# Altium footprint library 20210518.PcbLib: 414 footprints (part 4 of 26)
Each footprint in its own frame and in the unit in brackets; x right, y up, seen from the top. Pads: shape width x height; smd on the part's side, far side on the other; paste and mask are expansions set on the pad; w line width, h text height; cw(c..) or ccw(c..) is an arc to the next point about the centre after c.
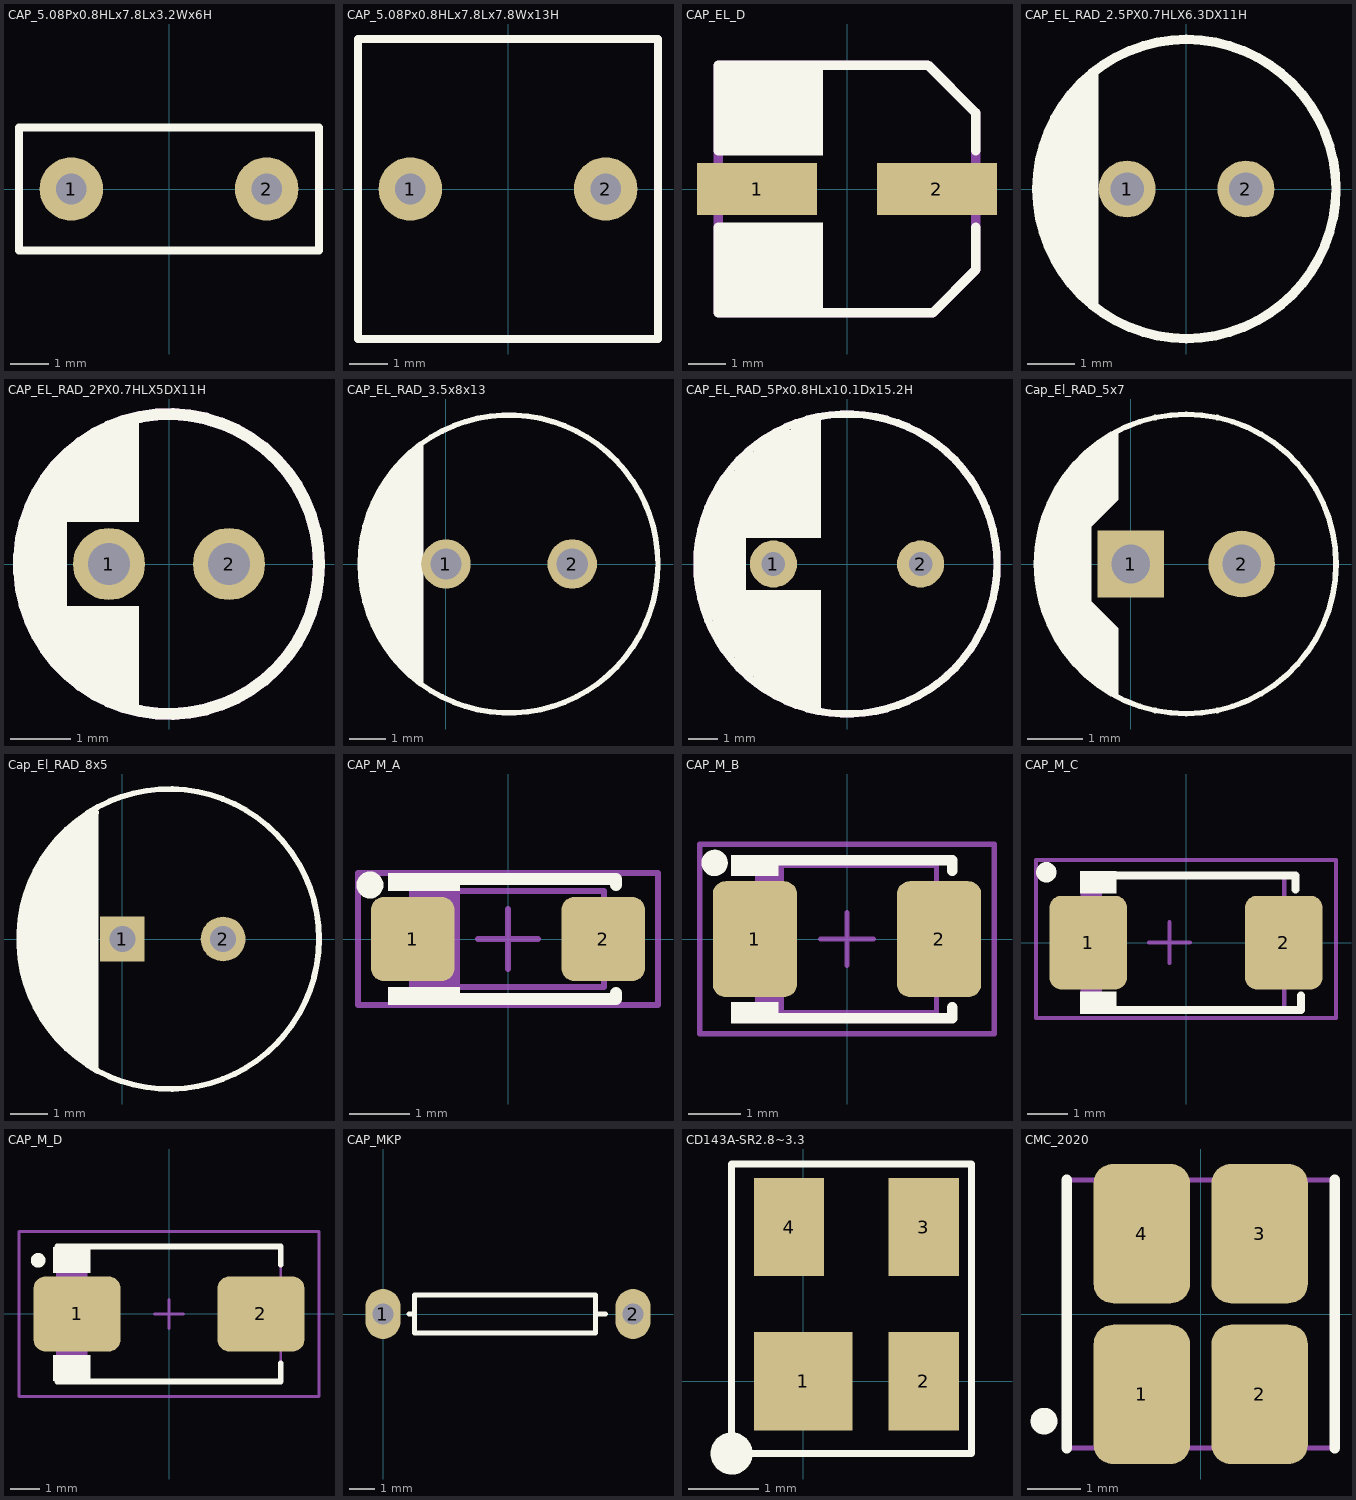
[diagram p3: the footprints below, top view; thin cyan lines are the x and y axes]

## CAP_5.08Px0.8HLx7.8Lx3.2Wx6H [mm] "Capacitor, Ceramic, Thru-Hole, Dipped Radial; Body 7.8 x 3.2 mm (WxT) Pin Spacing 5.08 mm (typ)"
height 6
pads (2):
  round 1.65 hole 0.8: 1(-2.54,0) 2(2.54,0)
Top Overlay:
  lines w0.2: -3.9,-1.6 3.9,-1.6 3.9,1.6 -3.9,1.6 -3.9,-1.6
3D body: height 2, standoff 0, extent -2.667,-0.2 -2.269,0.2
3D body: height 2, standoff 0, extent 2.341,-0.127 2.739,0.272
3D body: height 6, standoff 2, extent -3.937,-1.651 3.937,1.651

## CAP_5.08Px0.8HLx7.8Lx7.8Wx13H [mm] "Capacitor, MKT, Thru-Hole, Dipped Radial; Body 7.8 x 7.8mm (WxT) Pin Spacing 5.08 mm (typ)"
height 13
pads (2):
  round 1.65 hole 0.8: 1(-2.54,0) 2(2.54,0)
Top Overlay:
  lines w0.2: -3.9,-3.9 3.9,-3.9 3.9,3.9 -3.9,3.9 -3.9,-3.9
3D body: height 2, standoff 0, extent -2.667,-0.2 -2.269,0.2
3D body: height 2, standoff 0, extent 2.341,-0.127 2.739,0.272
3D body: height 13, standoff 0, extent -3.937,-3.9 3.937,3.9

## CAP_EL_D [mm] "Electrolitic Capacitor, D size SMD"
height 5.4
pads (2):
  rect 3.2x1.4 smd: 1(-2.4,0) 2(2.4,0)
Top Overlay:
  rectangle: -3.429,0.889 -0.635,3.175
  rectangle: -3.429,-3.175 -0.635,-0.889
  lines w0.254: -3.429,-1.016 -3.429,-3.302 2.286,-3.302 3.429,-2.159 3.429,-1.651 3.429,-1.016 ; -3.429,1.016 -3.429,3.302 2.159,3.302 3.429,2.032 3.429,1.016
Mechanical 13:
  lines w0.254: -3.429,-3.302 -3.429,3.302 2.159,3.302 3.429,2.032 3.429,-2.159 2.286,-3.302 -3.429,-3.302
Mechanical 15:
  lines w0.254: -3.429,-3.302 -3.429,3.302 2.159,3.302 3.429,2.032 3.429,-2.159 2.286,-3.302 -3.429,-3.302
3D body: height 5.41, standoff -0.01, extent -3.4,-3.3 3.6,3.3

## CAP_EL_RAD_2.5PX0.7HLX6.3DX11H [mm] "Capacitor,2.5mm pinspacing, 5mm diamater, 11mm height"
pads (2):
  round 1.2 hole 0.7: 1(-1.25,0) 2(1.25,0)
Top Overlay:
  circle w0.2: c0,0 r3.15
  region: -1.86,2.54 -1.86,-2.5 -1.94,-2.5 -2.4,-2.04 -2.43,-2.04 -2.43,-1.89 -2.89,-1.43 -2.89,-1.02 -3.11,-0.8 -3.11,-0.07 -3.17,-0.01 -3.13,0.03 -3.13,0.81 -2.87,1.07 -2.87,1.53
3D body: height 12.61, standoff -3.96, extent -3.372,-3.394 3.444,3.414

## CAP_EL_RAD_2PX0.7HLX5DX11H [mm] "Capacitor,2mm pinspacing, 5mm diamater, 11mm height"
pads (2):
  round 1.2 hole 0.7: 1(-1,0) 2(1,0)
Top Overlay:
  circle w0.2: c0,0 r2.5
  region: -0.5,0.7 -1.7,0.7 -1.7,-0.7 -0.5,-0.7 -0.5,-2.4 -0.9,-2.4 -1.2,-2.1 -1.4,-2.1 -2.2,-1.3 -2.2,-1 -2.5,-0.7 -2.5,0.5 -2.4,0.6 -2.4,0.9 -2.2,1.1 -2.2,1.3 -1.3,2.2 -1.1,2.2 -0.9,2.4 -0.5,2.4
3D Body:
  circle w0.2: c0,0 r2.5
Mechanical 13:
  circle w0.2: c0,0 r2.5
3D body: height 11, standoff -19, extent -2.5,-2.5 2.5,2.5

## CAP_EL_RAD_3.5x8x13 [mil]
pads (2):
  round 54 hole 34 mask-1000: 1(0,0) 2(137.8,0)
Top Overlay:
  circle w6: c68.9,0 r162.5
  region: -24.79,-130.34 -24.79,130.34 -14.7,137.59 -0.37,144.81 0.84,145.37 1.36,145.62 1.98,146.78 1.98,147.17 1.98,147.57 1.52,148.69 -0.27,149.23 -0.84,148.97 -8.92,145.19 -24.42,135.52 -27.94,132.96 -33.12,129.18 -47.66,116.56 -61.88,100.35 -73.85,82.42 -83.39,63.08 -90.32,42.66 -94.53,21.52 -95.94,0 -94.53,-21.52 -90.32,-42.66 -83.39,-63.08 -73.85,-82.42 -61.88,-100.35 -47.66,-116.56 -31.45,-130.77 -9.46,-144.88 -1.6,-148.61 -1.03,-148.88 0.77,-148.34 1.24,-147.21 1.24,-146.82 1.24,-146.42 0.62,-145.27 0.1,-145.03 -6.62,-141.84 -19.83,-133.9
  lines w3.94: -26.77,-130.55 -26.77,131.36 ; -0.75,-146.82 cw(c68.9,0) 0,147.17
Top Solder:
  region: 0,27.23 -7.05,26.31 -13.62,23.58 -19.26,19.26 -23.58,13.62 -26.31,7.05 -27.23,0 -26.31,-7.05 -23.58,-13.62 -19.26,-19.26 -13.62,-23.58 -7.05,-26.31 0,-27.23 7.05,-26.31 13.62,-23.58 19.26,-19.26 23.58,-13.62 26.31,-7.05 27.23,0 26.31,7.05 23.58,13.62 19.26,19.26 13.62,23.58 7.05,26.31
  region: 137.8,-27.23 144.84,-26.31 151.41,-23.58 157.05,-19.26 161.38,-13.62 164.1,-7.05 165.03,0 164.1,7.05 161.38,13.62 157.05,19.26 151.41,23.58 144.84,26.31 137.8,27.23 130.75,26.31 124.18,23.58 118.54,19.26 114.21,13.62 111.49,7.05 110.56,0 111.49,-7.05 114.21,-13.62 118.54,-19.26 124.18,-23.58 130.75,-26.31
Bottom Solder:
  region: 0,27.23 -7.05,26.31 -13.62,23.58 -19.26,19.26 -23.58,13.62 -26.31,7.05 -27.23,0 -26.31,-7.05 -23.58,-13.62 -19.26,-19.26 -13.62,-23.58 -7.05,-26.31 0,-27.23 7.05,-26.31 13.62,-23.58 19.26,-19.26 23.58,-13.62 26.31,-7.05 27.23,0 26.31,7.05 23.58,13.62 19.26,19.26 13.62,23.58 7.05,26.31
  region: 137.8,-27.23 144.84,-26.31 151.41,-23.58 157.05,-19.26 161.38,-13.62 164.1,-7.05 165.03,0 164.1,7.05 161.38,13.62 157.05,19.26 151.41,23.58 144.84,26.31 137.8,27.23 130.75,26.31 124.18,23.58 118.54,19.26 114.21,13.62 111.49,7.05 110.56,0 111.49,-7.05 114.21,-13.62 118.54,-19.26 124.18,-23.58 130.75,-26.31
3D body: height 413.62, standoff -172.01, extent -88.87,-157.37 226.4,157.37

## CAP_EL_RAD_5Px0.8HLx10.1Dx15.2H [mm] "Electrolitic Radial Capacitor, 5mm pin space, 0.8mm Hole, 10.1mm diametre, 15.2 height"
height 15.2
pads (2):
  round 1.6 hole 0.8: 1(-2.5,0) 2(2.5,0)
Top Overlay:
  circle w0.254: c0,0 r5.1
  rectangle: -5.08,-0.889 -3.429,1.016
  rectangle: -4.953,-1.27 -0.889,-0.889
  rectangle: -1.27,0.889 -0.889,4.953
  region: -0.889,-1.905 -0.889,-1.27 -4.826,-1.27 -4.826,-1.905
  region: -1.016,-2.54 -1.016,-1.905 -4.572,-1.905 -4.572,-2.54
  region: -1.016,-2.921 -1.016,-2.54 -4.318,-2.54 -4.318,-2.921
  region: -1.016,-3.175 -1.016,-2.921 -4.064,-2.921 -4.064,-3.175
  region: -1.016,-3.556 -1.016,-3.175 -3.81,-3.175 -3.81,-3.556
  region: -1.016,-3.81 -1.016,-3.556 -3.556,-3.556 -3.556,-3.81
  region: -0.889,-4.953 -0.889,-1.778 -1.016,-1.778 -1.016,-4.953
  region: -1.016,-4.953 -1.016,-3.683 -1.651,-3.683 -1.651,-4.953
  region: -1.651,-4.699 -1.651,-3.556 -2.032,-3.556 -2.032,-4.699
  region: -2.032,-4.572 -2.032,-3.683 -2.286,-3.683 -2.286,-4.572
  region: -2.286,-4.445 -2.286,-3.683 -2.54,-3.683 -2.54,-4.445
  region: -2.54,-4.318 -2.54,-3.556 -2.794,-3.556 -2.794,-4.318
  region: -2.667,-4.191 -2.667,-3.556 -3.048,-3.556 -3.048,-4.191
  region: -2.921,-4.064 -2.921,-3.556 -3.175,-3.556 -3.175,-4.064
  rectangle: -4.064,2.921 -3.556,3.175
  rectangle: -4.191,2.667 -3.556,3.048
  rectangle: -4.318,2.54 -3.556,2.794
  rectangle: -4.445,2.286 -3.683,2.54
  rectangle: -4.572,2.032 -3.683,2.286
  rectangle: -4.699,1.651 -3.556,2.032
  rectangle: -4.953,1.016 -3.683,1.651
  rectangle: -4.953,0.889 -1.778,1.016
  rectangle: -3.81,1.016 -3.556,3.556
  rectangle: -3.556,1.016 -3.175,3.81
  rectangle: -3.175,1.016 -2.921,4.064
  rectangle: -2.921,1.016 -2.54,4.318
  rectangle: -2.54,1.016 -1.905,4.572
  rectangle: -1.905,0.889 -1.27,4.826
Mechanical 13:
  circle w0.254: c0,0 r5.1
Mechanical 15:
  circle w0.254: c0,0 r5.1
3D body: height 16, standoff -19, extent -5.1,-5.1 4.9,4.9

## Cap_El_RAD_5x7 [mm] "Cap El 5x7"
pads (2):
  rect 1.2x1.2 hole 0.7: 1(0,0)
  round 1.2 hole 0.7: 2(2,0)
Top Overlay:
  circle w0.1: c1,0 r2.7
  region: -0.275,-2.35 -0.454,-2.256 -0.93,-1.88 -1.201,-1.563 -1.419,-1.207 -1.578,-0.821 -1.676,-0.416 -1.708,0 -1.676,0.416 -1.578,0.821 -1.419,1.207 -1.201,1.563 -0.93,1.88 -0.454,2.256 -0.275,2.35 -0.275,1.175 -0.762,0.688 -0.762,-0.688 -0.275,-1.175
  lines w0.1: 1,-2.7 cw(c1,0) 1,2.7 ; -0.762,-0.688 -0.762,0.688 -0.275,1.175 -0.275,2.35 ccw(c0.95,0) -0.275,-2.35 -0.275,-1.175 -0.762,-0.688
3D body: height 8.61, standoff -19.9, extent -1.75,-2.75 3.75,2.75

## Cap_El_RAD_8x5 [mm] "Cap El 8x5"
pads (2):
  rect 1.2x1.2 hole 0.7: 1(0,0)
  round 1.2 hole 0.7: 2(2.7,0)
Top Overlay:
  circle w0.152: c1.25,0 r4.02
  region: -0.717,-3.595 -0.702,-3.604 -0.64,-3.572 -0.64,-3.552 -0.64,3.323 -0.64,3.333 -0.652,3.362 -0.691,3.376 -0.704,3.372 -0.701,3.375 -0.698,3.383 -0.698,3.387 -0.691,3.401 -0.705,3.446 -0.755,3.46 -0.77,3.45 -0.968,3.326 -1.504,2.877 -1.862,2.469 -2.163,2.018 -2.403,1.531 -2.578,1.018 -2.683,0.486 -2.719,-0.056 -2.683,-0.597 -2.578,-1.129 -2.403,-1.643 -2.163,-2.129 -1.862,-2.58 -1.504,-2.988 -0.93,-3.466
  lines w0.1: -0.723,3.456 -0.723,3.415 -0.681,3.373 ; -0.67,3.371 -0.67,3.405
3D body: height 5, standoff 0, extent -2.77,-4.067 5.27,3.967

## CAP_M_A [mil] "Molded Capacitor, 2-Leads, Body 3,2x1,6mm, IPC Low Density"
height 62.99
pads (2):
  rrect30% 55x55 smd: 1(-62.5,0) 2(62.5,0)
Top Overlay:
  circle w9.84: c-90.55,35.43 r3.94
  rectangle: -78.74,31.5 -31.5,43.31
  rectangle: -78.74,-43.31 -31.5,-31.5
  lines w7.87: -70.87,-35.43 -70.87,-39.37 70.87,-39.37 70.87,-35.43 ; -70.87,35.43 -70.87,39.37 70.87,39.37 70.87,35.43
Mechanical 13:
  rectangle: -62.99,-31.5 -31.5,31.5
  lines w3.94: -62.99,-31.5 -62.99,31.5 62.99,31.5 62.99,-31.5 -62.99,-31.5
Mechanical 15:
  lines w3.94: -19.68,0 19.68,0 ; 0,-19.69 0,19.68 ; -98.43,-43.31 -98.43,43.31 98.43,43.31 98.43,-43.31 -98.43,-43.31
3D body: height 67.32, standoff 0, extent -66.93,-33.08 66.92,33.07

## CAP_M_B [mm] "Molded Capacitor, 2-Leads, Body 3,5x2,8mm, IPC Low Density"
height 1.9
pads (2):
  rrect30% 1.6x2.2 smd: 1(-1.75,0) 2(1.75,0)
Top Overlay:
  circle w0.25: c-2.515,1.448 r0.125
  rectangle: -2.2,-1.6 -1.3,-1.2
  rectangle: -2.2,1.2 -1.3,1.6
  lines w0.2: -2,-1.5 2,-1.5 2,-1.3 ; -2,1.5 2,1.5 2,1.3
Mechanical 13:
  rectangle: -1.7,-1.4 -1.2,1.4
  lines w0.1: -1.7,-1.4 -1.7,1.4 1.7,1.4 1.7,-1.4 -1.7,-1.4
Mechanical 15:
  lines w0.1: -2.8,1.8 -2.8,-1.8 2.8,-1.8 2.8,1.803 -2.8,1.803 ; -0.5,0 0.5,0 ; 0,-0.5 0,0.5
3D body: height 1.9, standoff -0.01, extent -1.831,-1.4 1.831,1.4

## CAP_M_C [mm] "Molded Capacitor, 2-Leads, Body 6x3.2mm, IPC Low Density"
height 1.9
pads (2):
  rrect30% 1.9x2.3 smd: 1(-2.4,0) 2(2.4,0)
Top Overlay:
  circle w0.25: c-3.429,1.727 r0.125
  rectangle: -2.608,-1.753 -1.708,-1.2
  rectangle: -2.608,1.2 -1.708,1.753
  lines w0.2: -2.408,-1.5 -2.257,-1.651 2.819,-1.651 2.819,-1.3 ; -2.408,1.5 -2.257,1.651 2.692,1.651 2.692,1.3
Mechanical 13:
  rectangle: -2.591,-1.397 -2.091,1.403
  lines w0.1: -2.108,-1.651 -2.108,1.651 2.413,1.651 2.413,-1.651 -2.108,-1.651
Mechanical 15:
  lines w0.1: -0.908,0 0.092,0 ; -0.408,-0.5 -0.408,0.5 ; -3.683,-1.854 3.683,-1.854 3.683,2.032 -3.683,2.032 -3.683,-1.854
3D body: height 2.8, standoff 0, extent -3.15,-1.75 3.15,1.75

## CAP_M_D [mm] "Molded Capacitor, 2-Leads, Body 7,3x4,3mm, IPC Low Density"
height 2.8
pads (2):
  rrect30% 2.95x2.55 smd: 1(-3.125,0) 2(3.125,0)
Top Overlay:
  circle w0.25: c-4.45,1.825 r0.125
  rectangle: -3.937,1.397 -2.667,2.286
  rectangle: -3.937,-2.286 -2.667,-1.397
  lines w0.2: -3.8,-1.675 -3.8,-2.3 3.8,-2.3 3.8,-1.675 ; -3.8,1.675 -3.8,2.3 3.8,2.3 3.8,1.675
Mechanical 13:
  rectangle: -3.8,-2.3 -2.778,2.3
  lines w0.1: -3.8,-2.3 -3.8,2.3 3.8,2.3 3.8,-2.3 -3.8,-2.3
Mechanical 15:
  lines w0.1: -0.5,0 0.5,0 ; 0,-0.5 0,0.5 ; -5.1,-2.8 -5.1,2.8 5.1,2.8 5.1,-2.8 -5.1,-2.8
3D body: height 3.1, standoff -0.04, extent -4.498,-2.3 4.498,2.31

## CAP_MKP [mm] "10nF -400V AC MKP"
height 1.524
pads (2):
  oval 1.4x2 hole 0.85: 1(-0.01,0) 2(10,0)
Top Overlay:
  lines w0.2: 1.031,0 1.26,0 ; 8.5,0 8.9,0 ; 1.26,-0.762 8.5,-0.762 8.5,-0.1 8.5,0.6 8.5,0.762 1.26,0.762 1.26,-0.762
3D body: height 10, standoff -4.9, extent -1.16,-1.85 11.16,2.1

## CD143A-SR2.8~3.3 [mm]
pads (4):
  rect 1.4x1.4 smd: 1(0,0)
  rect 1x1.4 smd: 2(1.72,0) 3(1.72,2.2) 4(-0.2,2.2)
Top Overlay:
  circle w0.3: c-1.02,-1.03 r0.15
  lines w0.1: -1.02,-1.03 -1.02,3.1 2.4,3.1 2.4,-1.03 -1.02,-1.03
3D body: height 1.09, standoff 0.04, extent -0.68,-0.087 2.24,2.208

## CMC_2020 [mm] "Common Mode Choke 2020 size"
height 2.35
pads (4):
  rrect40% 1.8x2.6 smd: 1(-1.1,-1.5) 2(1.1,-1.5) 3(1.1,1.5) 4(-1.1,1.5)
Top Overlay:
  circle w0.25: c-2.925,-2 r0.125
  lines w0.2: -2.5,-2.5 -2.5,2.5 ; 2.5,-2.5 2.5,2.5
Mechanical 13:
  lines w0.1: -2.5,-2.5 -2.5,2.5 2.5,2.5 2.5,-2.5 -2.5,-2.5
Mechanical 15:
  lines w0.1: -1.6,-1.5 -0.6,-1.5 ; -1.1,-2 -1.1,-1 ; -2.5,-2.5 -2.5,2.5 2.5,2.5 2.5,-2.5 -2.5,-2.5
3D body: height 2.35, standoff 0, extent -2.5,-2.5 2.5,2.5